# Altium footprint library AD_Lib.PcbLib: 508 footprints (part 11 of 32)
Each footprint in its own frame and in the unit in brackets; x right, y up, seen from the top. Pads: shape width x height; smd on the part's side, far side on the other; paste and mask are expansions set on the pad; w line width, h text height; cw(c..) or ccw(c..) is an arc to the next point about the centre after c.
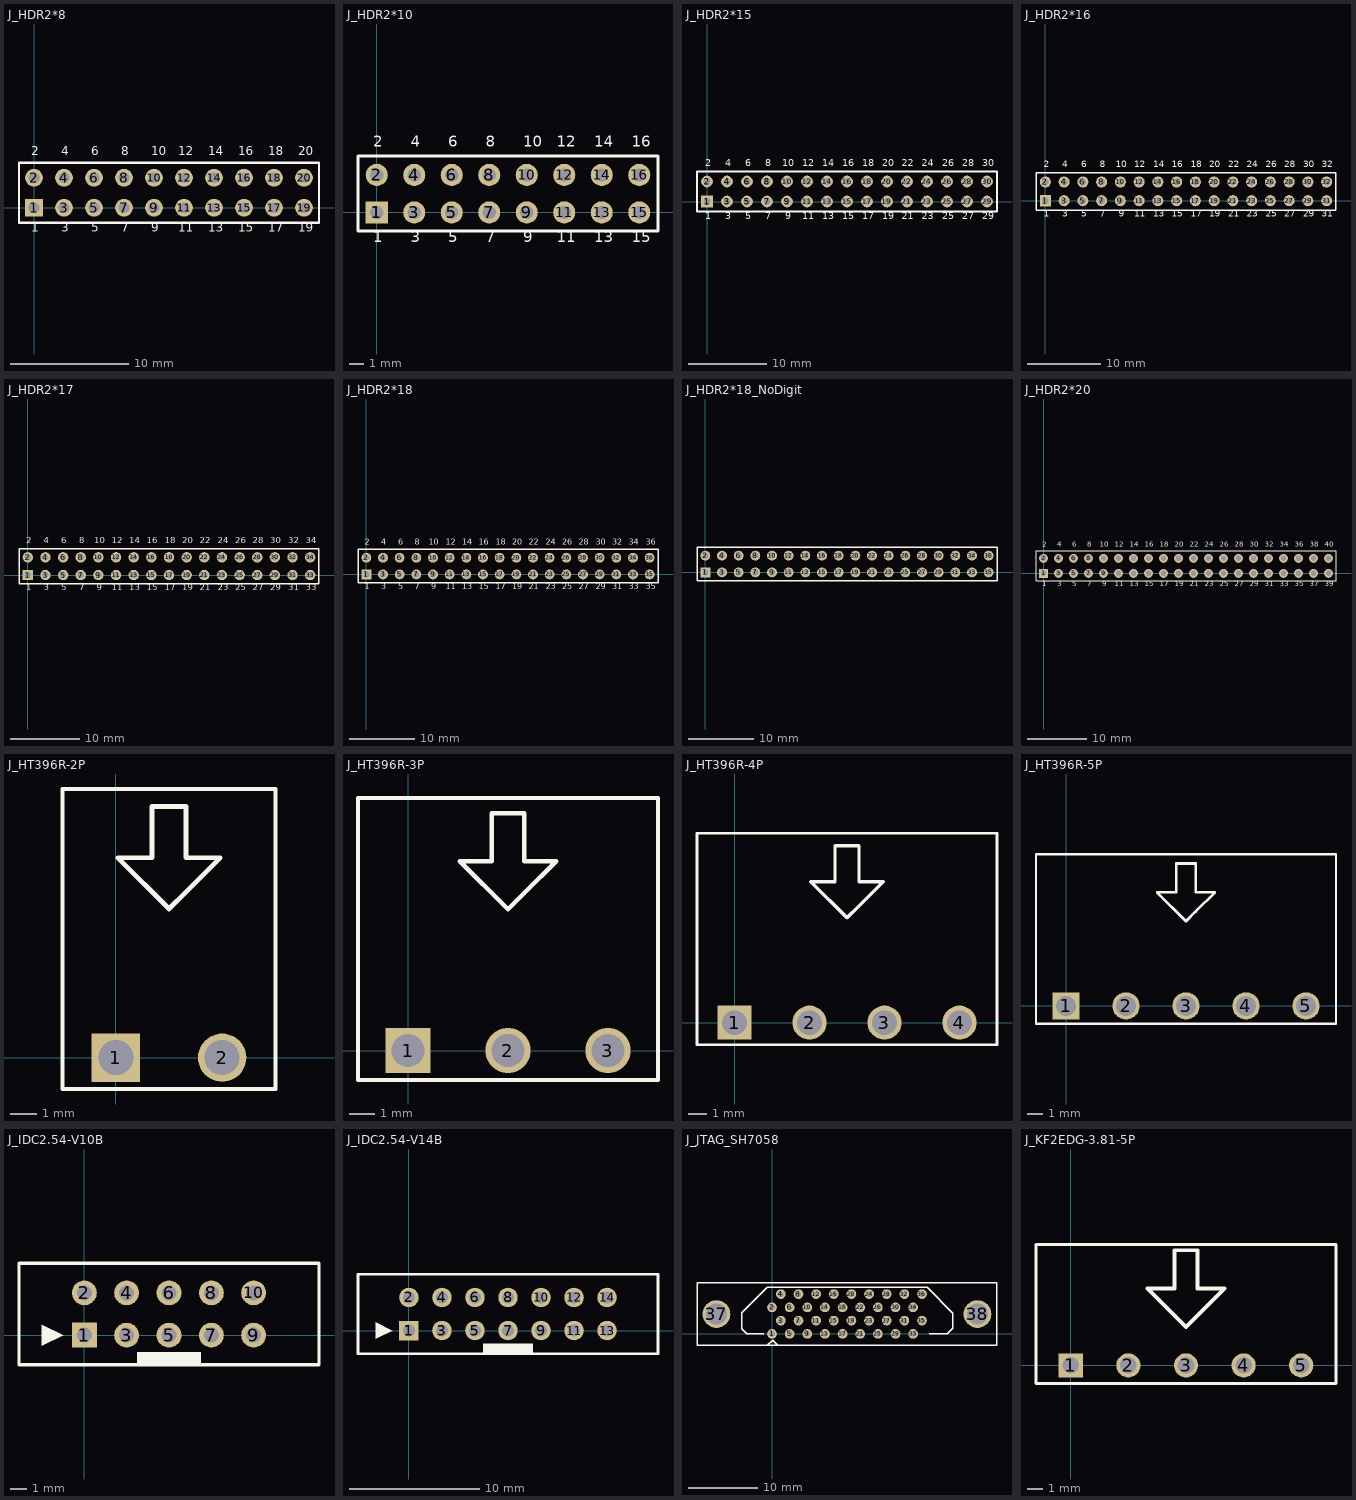
[diagram p10: the footprints below, top view; thin cyan lines are the x and y axes]

## J_HDR2*8 [mm] "Connector; Header; 2*8"
pads (20):
  rect 1.5x1.5 hole 0.9: 1(0,0)
  round 1.5 hole 0.9: 2(0,2.54) 3(2.54,0) 4(2.54,2.54) 5(5.08,0) 6(5.08,2.54) 7(7.62,0) 8(7.62,2.54) 9(10.16,0) 10(10.16,2.54) 11(12.7,0) 12(12.7,2.54) 13(15.24,0) 14(15.24,2.54) 15(17.78,0) 16(17.78,2.54) 17(20.32,0) 18(20.32,2.54) 19(22.86,0) 20(22.86,2.54)
Top Overlay:
  lines w0.2: -1.27,-1.27 -1.27,3.81 24.13,3.81 24.13,-1.27 -1.27,-1.27
  text "16" at 17.272,4.191 h1.27
  text "14" at 14.732,4.191 h1.27
  text "12" at 12.192,4.191 h1.27
  text "18" at 19.812,4.191 h1.27
  text "20" at 22.352,4.191 h1.27
  text "15" at 17.272,-2.286 h1.27
  text "13" at 14.732,-2.286 h1.27
  text "11" at 12.192,-2.286 h1.27
  text "17" at 19.812,-2.286 h1.27
  text "19" at 22.352,-2.286 h1.27
  text "10" at 9.906,4.191 h1.27
  text "8" at 7.366,4.191 h1.27
  text "6" at 4.826,4.191 h1.27
  text "4" at 2.286,4.191 h1.27
  text "2" at -0.254,4.191 h1.27
  text "9" at 9.906,-2.286 h1.27
  text "7" at 7.366,-2.286 h1.27
  text "5" at 4.826,-2.286 h1.27
  text "3" at 2.286,-2.286 h1.27
  text "1" at -0.254,-2.286 h1.27
Bottom Overlay:
  text "16" at 18.415,4.191 h1.27
  text "12" at 15.875,4.191 h1.27
  text "12" at 13.335,4.191 h1.27
  text "18" at 20.955,4.191 h1.27
  text "20" at 23.495,4.191 h1.27
  text "15" at 18.415,-2.286 h1.27
  text "13" at 15.875,-2.286 h1.27
  text "11" at 13.335,-2.286 h1.27
  text "17" at 20.955,-2.286 h1.27
  text "9" at 23.495,-2.286 h1.27
  text "1" at 0.254,-2.286 h1.27
  text "3" at 2.794,-2.286 h1.27
  text "5" at 5.334,-2.286 h1.27
  text "7" at 7.874,-2.286 h1.27
  text "9" at 10.414,-2.286 h1.27
  text "2" at 0.254,4.191 h1.27
  text "4" at 2.794,4.191 h1.27
  text "6" at 5.334,4.191 h1.27
  text "8" at 7.874,4.191 h1.27
  text "10" at 11.049,4.191 h1.27

## J_HDR2*10 [mm] "Connector; Header; 2*8"
pads (16):
  rect 1.5x1.5 hole 0.9: 1(0,0)
  round 1.5 hole 0.9: 2(0,2.54) 3(2.54,0) 4(2.54,2.54) 5(5.08,0) 6(5.08,2.54) 7(7.62,0) 8(7.62,2.54) 9(10.16,0) 10(10.16,2.54) 11(12.7,0) 12(12.7,2.54) 13(15.24,0) 14(15.24,2.54) 15(17.78,0) 16(17.78,2.54)
Top Overlay:
  lines w0.2: -1.27,-1.27 -1.27,3.81 19.05,3.81 19.05,-1.27 -1.27,-1.27
  text "16" at 17.272,4.191 h1.27
  text "14" at 14.732,4.191 h1.27
  text "12" at 12.192,4.191 h1.27
  text "15" at 17.272,-2.286 h1.27
  text "13" at 14.732,-2.286 h1.27
  text "11" at 12.192,-2.286 h1.27
  text "10" at 9.906,4.191 h1.27
  text "8" at 7.366,4.191 h1.27
  text "6" at 4.826,4.191 h1.27
  text "4" at 2.286,4.191 h1.27
  text "2" at -0.254,4.191 h1.27
  text "9" at 9.906,-2.286 h1.27
  text "7" at 7.366,-2.286 h1.27
  text "5" at 4.826,-2.286 h1.27
  text "3" at 2.286,-2.286 h1.27
  text "1" at -0.254,-2.286 h1.27
Bottom Overlay:
  text "16" at 18.415,4.191 h1.27
  text "12" at 15.875,4.191 h1.27
  text "12" at 13.335,4.191 h1.27
  text "15" at 18.415,-2.286 h1.27
  text "13" at 15.875,-2.286 h1.27
  text "11" at 13.335,-2.286 h1.27
  text "1" at 0.254,-2.286 h1.27
  text "3" at 2.794,-2.286 h1.27
  text "5" at 5.334,-2.286 h1.27
  text "7" at 7.874,-2.286 h1.27
  text "9" at 10.414,-2.286 h1.27
  text "2" at 0.254,4.191 h1.27
  text "4" at 2.794,4.191 h1.27
  text "6" at 5.334,4.191 h1.27
  text "8" at 7.874,4.191 h1.27
  text "10" at 11.049,4.191 h1.27

## J_HDR2*15 [mm] "Connector; Header; 2*15"
height 1.45
pads (30):
  rect 1.5x1.5 hole 0.9: 1(0,0)
  round 1.5 hole 0.9: 2(0,2.54) 3(2.54,0) 4(2.54,2.54) 5(5.08,0) 6(5.08,2.54) 7(7.62,0) 8(7.62,2.54) 9(10.16,0) 10(10.16,2.54) 11(12.7,0) 12(12.7,2.54) 13(15.24,0) 14(15.24,2.54) 15(17.78,0) 16(17.78,2.54) 17(20.32,0) 18(20.32,2.54) 19(22.86,0) 20(22.86,2.54) 21(25.4,0) 22(25.4,2.54) 23(27.94,0) 24(27.94,2.54) 25(30.48,0) 26(30.48,2.54) 27(33.02,0) 28(33.02,2.54) 29(35.56,0) 30(35.56,2.54)
Top Overlay:
  lines w0.2: -1.27,-1.27 36.83,-1.27 36.83,3.81 -1.27,3.81 -1.27,-1.27
  text "7" at 7.366,-2.54 h1.52
  text "5" at 4.826,-2.54 h1.52
  text "3" at 2.286,-2.54 h1.52
  text "1" at -0.254,-2.54 h1.52
  text "9" at 9.906,-2.54 h1.52
  text "11" at 12.065,-2.54 h1.52
  text "23" at 27.305,-2.54 h1.52
  text "21" at 24.765,-2.54 h1.52
  text "19" at 22.225,-2.54 h1.52
  text "17" at 19.685,-2.54 h1.52
  text "15" at 17.145,-2.54 h1.52
  text "13" at 14.605,-2.54 h1.52
  text "29" at 34.925,-2.54 h1.52
  text "27" at 32.385,-2.54 h1.52
  text "25" at 29.845,-2.54 h1.52
  text "26" at 29.845,4.191 h1.52
  text "28" at 32.385,4.191 h1.52
  text "30" at 34.925,4.191 h1.52
  text "14" at 14.605,4.191 h1.52
  text "16" at 17.145,4.191 h1.52
  text "18" at 19.685,4.191 h1.52
  text "20" at 22.225,4.191 h1.52
  text "22" at 24.765,4.191 h1.52
  text "24" at 27.305,4.191 h1.52
  text "12" at 12.065,4.191 h1.52
  text "10" at 9.525,4.191 h1.52
  text "2" at -0.254,4.191 h1.52
  text "4" at 2.286,4.191 h1.52
  text "6" at 4.826,4.191 h1.52
  text "8" at 7.366,4.191 h1.52
Bottom Overlay:
  text "12" at 13.208,4.191 h1.52
  text "24" at 28.448,4.191 h1.52
  text "22" at 25.908,4.191 h1.52
  text "20" at 23.368,4.191 h1.52
  text "18" at 20.828,4.191 h1.52
  text "16" at 18.288,4.191 h1.52
  text "14" at 15.748,4.191 h1.52
  text "30" at 36.068,4.191 h1.52
  text "28" at 33.528,4.191 h1.52
  text "26" at 30.988,4.191 h1.52
  text "10" at 10.541,4.191 h1.52
  text "2" at 0.254,4.191 h1.52
  text "4" at 2.794,4.191 h1.52
  text "6" at 5.334,4.191 h1.52
  text "8" at 7.874,4.191 h1.52
  text "7" at 7.874,-2.54 h1.52
  text "5" at 5.334,-2.54 h1.52
  text "3" at 2.794,-2.54 h1.52
  text "1" at 0.254,-2.54 h1.52
  text "9" at 10.414,-2.54 h1.52
  text "25" at 30.988,-2.54 h1.52
  text "27" at 33.528,-2.54 h1.52
  text "29" at 36.068,-2.54 h1.52
  text "13" at 15.748,-2.54 h1.52
  text "15" at 18.288,-2.54 h1.52
  text "17" at 20.828,-2.54 h1.52
  text "19" at 23.368,-2.54 h1.52
  text "21" at 25.908,-2.54 h1.52
  text "23" at 28.448,-2.54 h1.52
  text "11" at 13.208,-2.54 h1.52

## J_HDR2*16 [mm] "Connector; Header; 2*16"
height 1.45
pads (32):
  rect 1.5x1.5 hole 0.9: 1(0,0)
  round 1.5 hole 0.9: 2(0,2.54) 3(2.54,0) 4(2.54,2.54) 5(5.08,0) 6(5.08,2.54) 7(7.62,0) 8(7.62,2.54) 9(10.16,0) 10(10.16,2.54) 11(12.7,0) 12(12.7,2.54) 13(15.24,0) 14(15.24,2.54) 15(17.78,0) 16(17.78,2.54) 17(20.32,0) 18(20.32,2.54) 19(22.86,0) 20(22.86,2.54) 21(25.4,0) 22(25.4,2.54) 23(27.94,0) 24(27.94,2.54) 25(30.48,0) 26(30.48,2.54) 27(33.02,0) 28(33.02,2.54) 29(35.56,0) 30(35.56,2.54) 31(38.1,0) 32(38.1,2.54)
Top Overlay:
  lines w0.2: -1.27,-1.27 -1.27,3.81 39.37,3.81 39.37,-1.27 -1.27,-1.27
  text "8" at 7.366,4.191 h1.52
  text "6" at 4.826,4.191 h1.52
  text "4" at 2.286,4.191 h1.52
  text "2" at -0.254,4.191 h1.52
  text "10" at 9.525,4.191 h1.52
  text "12" at 12.065,4.191 h1.52
  text "24" at 27.305,4.191 h1.52
  text "22" at 24.765,4.191 h1.52
  text "20" at 22.225,4.191 h1.52
  text "18" at 19.685,4.191 h1.52
  text "16" at 17.145,4.191 h1.52
  text "14" at 14.605,4.191 h1.52
  text "30" at 34.925,4.191 h1.52
  text "28" at 32.385,4.191 h1.52
  text "26" at 29.845,4.191 h1.52
  text "25" at 29.845,-2.54 h1.52
  text "27" at 32.385,-2.54 h1.52
  text "29" at 34.925,-2.54 h1.52
  text "13" at 14.605,-2.54 h1.52
  text "15" at 17.145,-2.54 h1.52
  text "17" at 19.685,-2.54 h1.52
  text "19" at 22.225,-2.54 h1.52
  text "21" at 24.765,-2.54 h1.52
  text "23" at 27.305,-2.54 h1.52
  text "11" at 12.065,-2.54 h1.52
  text "9" at 9.906,-2.54 h1.52
  text "1" at -0.254,-2.54 h1.52
  text "3" at 2.286,-2.54 h1.52
  text "5" at 4.826,-2.54 h1.52
  text "7" at 7.366,-2.54 h1.52
  text "31" at 37.465,-2.54 h1.52
  text "32" at 37.465,4.191 h1.52
Bottom Overlay:
  text "11" at 13.208,-2.54 h1.52
  text "23" at 28.448,-2.54 h1.52
  text "21" at 25.908,-2.54 h1.52
  text "19" at 23.368,-2.54 h1.52
  text "17" at 20.828,-2.54 h1.52
  text "15" at 18.288,-2.54 h1.52
  text "13" at 15.748,-2.54 h1.52
  text "29" at 36.068,-2.54 h1.52
  text "27" at 33.528,-2.54 h1.52
  text "25" at 30.988,-2.54 h1.52
  text "9" at 10.414,-2.54 h1.52
  text "1" at 0.254,-2.54 h1.52
  text "3" at 2.794,-2.54 h1.52
  text "5" at 5.334,-2.54 h1.52
  text "7" at 7.874,-2.54 h1.52
  text "8" at 7.874,4.191 h1.52
  text "6" at 5.334,4.191 h1.52
  text "4" at 2.794,4.191 h1.52
  text "2" at 0.254,4.191 h1.52
  text "10" at 10.541,4.191 h1.52
  text "26" at 30.988,4.191 h1.52
  text "28" at 33.528,4.191 h1.52
  text "30" at 36.068,4.191 h1.52
  text "14" at 15.748,4.191 h1.52
  text "16" at 18.288,4.191 h1.52
  text "18" at 20.828,4.191 h1.52
  text "20" at 23.368,4.191 h1.52
  text "22" at 25.908,4.191 h1.52
  text "24" at 28.448,4.191 h1.52
  text "12" at 13.208,4.191 h1.52
  text "32" at 38.608,4.191 h1.52
  text "31" at 38.608,-2.54 h1.52

## J_HDR2*17 [mm] "Connector; Header; 2*17"
height 1.45
pads (34):
  rect 1.5x1.5 hole 0.9: 1(0,0)
  round 1.5 hole 0.9: 2(0,2.54) 3(2.54,0) 4(2.54,2.54) 5(5.08,0) 6(5.08,2.54) 7(7.62,0) 8(7.62,2.54) 9(10.16,0) 10(10.16,2.54) 11(12.7,0) 12(12.7,2.54) 13(15.24,0) 14(15.24,2.54) 15(17.78,0) 16(17.78,2.54) 17(20.32,0) 18(20.32,2.54) 19(22.86,0) 20(22.86,2.54) 21(25.4,0) 22(25.4,2.54) 23(27.94,0) 24(27.94,2.54) 25(30.48,0) 26(30.48,2.54) 27(33.02,0) 28(33.02,2.54) 29(35.56,0) 30(35.56,2.54) 31(38.1,0) 32(38.1,2.54) 33(40.64,0) 34(40.64,2.54)
Top Overlay:
  lines w0.2: -1.27,-1.27 -1.27,3.81 41.91,3.81 41.91,-1.27 -1.27,-1.27
  text "34" at 40.005,4.191 h1.52
  text "33" at 40.005,-2.54 h1.52
  text "8" at 7.366,4.191 h1.52
  text "6" at 4.826,4.191 h1.52
  text "4" at 2.286,4.191 h1.52
  text "2" at -0.254,4.191 h1.52
  text "10" at 9.525,4.191 h1.52
  text "12" at 12.065,4.191 h1.52
  text "24" at 27.305,4.191 h1.52
  text "22" at 24.765,4.191 h1.52
  text "20" at 22.225,4.191 h1.52
  text "18" at 19.685,4.191 h1.52
  text "16" at 17.145,4.191 h1.52
  text "14" at 14.605,4.191 h1.52
  text "30" at 34.925,4.191 h1.52
  text "28" at 32.385,4.191 h1.52
  text "26" at 29.845,4.191 h1.52
  text "25" at 29.845,-2.54 h1.52
  text "27" at 32.385,-2.54 h1.52
  text "29" at 34.925,-2.54 h1.52
  text "13" at 14.605,-2.54 h1.52
  text "15" at 17.145,-2.54 h1.52
  text "17" at 19.685,-2.54 h1.52
  text "19" at 22.225,-2.54 h1.52
  text "21" at 24.765,-2.54 h1.52
  text "23" at 27.305,-2.54 h1.52
  text "11" at 12.065,-2.54 h1.52
  text "9" at 9.906,-2.54 h1.52
  text "1" at -0.254,-2.54 h1.52
  text "3" at 2.286,-2.54 h1.52
  text "5" at 4.826,-2.54 h1.52
  text "7" at 7.366,-2.54 h1.52
  text "31" at 37.465,-2.54 h1.52
  text "32" at 37.465,4.191 h1.52
Bottom Overlay:
  text "33" at 41.148,-2.54 h1.52
  text "34" at 41.148,4.191 h1.52
  text "11" at 13.208,-2.54 h1.52
  text "23" at 28.448,-2.54 h1.52
  text "21" at 25.908,-2.54 h1.52
  text "19" at 23.368,-2.54 h1.52
  text "17" at 20.828,-2.54 h1.52
  text "15" at 18.288,-2.54 h1.52
  text "13" at 15.748,-2.54 h1.52
  text "29" at 36.068,-2.54 h1.52
  text "27" at 33.528,-2.54 h1.52
  text "25" at 30.988,-2.54 h1.52
  text "9" at 10.414,-2.54 h1.52
  text "1" at 0.254,-2.54 h1.52
  text "3" at 2.794,-2.54 h1.52
  text "5" at 5.334,-2.54 h1.52
  text "7" at 7.874,-2.54 h1.52
  text "8" at 7.874,4.191 h1.52
  text "6" at 5.334,4.191 h1.52
  text "4" at 2.794,4.191 h1.52
  text "2" at 0.254,4.191 h1.52
  text "10" at 10.541,4.191 h1.52
  text "26" at 30.988,4.191 h1.52
  text "28" at 33.528,4.191 h1.52
  text "30" at 36.068,4.191 h1.52
  text "14" at 15.748,4.191 h1.52
  text "16" at 18.288,4.191 h1.52
  text "18" at 20.828,4.191 h1.52
  text "20" at 23.368,4.191 h1.52
  text "22" at 25.908,4.191 h1.52
  text "24" at 28.448,4.191 h1.52
  text "12" at 13.208,4.191 h1.52
  text "32" at 38.608,4.191 h1.52
  text "31" at 38.608,-2.54 h1.52

## J_HDR2*18 [mm] "Connector; Header; 2*18"
height 1.45
pads (36):
  rect 1.5x1.5 hole 0.9: 1(0,0)
  round 1.5 hole 0.9: 2(0,2.54) 3(2.54,0) 4(2.54,2.54) 5(5.08,0) 6(5.08,2.54) 7(7.62,0) 8(7.62,2.54) 9(10.16,0) 10(10.16,2.54) 11(12.7,0) 12(12.7,2.54) 13(15.24,0) 14(15.24,2.54) 15(17.78,0) 16(17.78,2.54) 17(20.32,0) 18(20.32,2.54) 19(22.86,0) 20(22.86,2.54) 21(25.4,0) 22(25.4,2.54) 23(27.94,0) 24(27.94,2.54) 25(30.48,0) 26(30.48,2.54) 27(33.02,0) 28(33.02,2.54) 29(35.56,0) 30(35.56,2.54) 31(38.1,0) 32(38.1,2.54) 33(40.64,0) 34(40.64,2.54) 35(43.18,0) 36(43.18,2.54)
Top Overlay:
  lines w0.2: -1.27,-1.27 44.45,-1.27 44.45,3.81 -1.27,3.81 -1.27,-1.27
  text "36" at 42.545,4.191 h1.52
  text "35" at 42.545,-2.54 h1.52
  text "32" at 37.465,4.191 h1.52
  text "31" at 37.465,-2.54 h1.52
  text "7" at 7.366,-2.54 h1.52
  text "5" at 4.826,-2.54 h1.52
  text "3" at 2.286,-2.54 h1.52
  text "1" at -0.254,-2.54 h1.52
  text "9" at 9.906,-2.54 h1.52
  text "11" at 12.065,-2.54 h1.52
  text "23" at 27.305,-2.54 h1.52
  text "21" at 24.765,-2.54 h1.52
  text "19" at 22.225,-2.54 h1.52
  text "17" at 19.685,-2.54 h1.52
  text "15" at 17.145,-2.54 h1.52
  text "13" at 14.605,-2.54 h1.52
  text "29" at 34.925,-2.54 h1.52
  text "27" at 32.385,-2.54 h1.52
  text "25" at 29.845,-2.54 h1.52
  text "26" at 29.845,4.191 h1.52
  text "28" at 32.385,4.191 h1.52
  text "30" at 34.925,4.191 h1.52
  text "14" at 14.605,4.191 h1.52
  text "16" at 17.145,4.191 h1.52
  text "18" at 19.685,4.191 h1.52
  text "20" at 22.225,4.191 h1.52
  text "22" at 24.765,4.191 h1.52
  text "24" at 27.305,4.191 h1.52
  text "12" at 12.065,4.191 h1.52
  text "10" at 9.525,4.191 h1.52
  text "2" at -0.254,4.191 h1.52
  text "4" at 2.286,4.191 h1.52
  text "6" at 4.826,4.191 h1.52
  text "8" at 7.366,4.191 h1.52
  text "33" at 40.005,-2.54 h1.52
  text "34" at 40.005,4.191 h1.52
Bottom Overlay:
  text "35" at 43.688,-2.54 h1.52
  text "36" at 43.688,4.191 h1.52
  text "31" at 38.608,-2.54 h1.52
  text "32" at 38.608,4.191 h1.52
  text "12" at 13.208,4.191 h1.52
  text "24" at 28.448,4.191 h1.52
  text "22" at 25.908,4.191 h1.52
  text "20" at 23.368,4.191 h1.52
  text "18" at 20.828,4.191 h1.52
  text "16" at 18.288,4.191 h1.52
  text "14" at 15.748,4.191 h1.52
  text "30" at 36.068,4.191 h1.52
  text "28" at 33.528,4.191 h1.52
  text "26" at 30.988,4.191 h1.52
  text "10" at 10.541,4.191 h1.52
  text "2" at 0.254,4.191 h1.52
  text "4" at 2.794,4.191 h1.52
  text "6" at 5.334,4.191 h1.52
  text "8" at 7.874,4.191 h1.52
  text "7" at 7.874,-2.54 h1.52
  text "5" at 5.334,-2.54 h1.52
  text "3" at 2.794,-2.54 h1.52
  text "1" at 0.254,-2.54 h1.52
  text "9" at 10.414,-2.54 h1.52
  text "25" at 30.988,-2.54 h1.52
  text "27" at 33.528,-2.54 h1.52
  text "29" at 36.068,-2.54 h1.52
  text "13" at 15.748,-2.54 h1.52
  text "15" at 18.288,-2.54 h1.52
  text "17" at 20.828,-2.54 h1.52
  text "19" at 23.368,-2.54 h1.52
  text "21" at 25.908,-2.54 h1.52
  text "23" at 28.448,-2.54 h1.52
  text "11" at 13.208,-2.54 h1.52
  text "34" at 41.148,4.191 h1.52
  text "33" at 41.148,-2.54 h1.52

## J_HDR2*18_NoDigit [mm] "Connector; Header; 2*18"
height 1.45
pads (36):
  rect 1.5x1.5 hole 0.9: 1(0,0)
  round 1.5 hole 0.9: 2(0,2.54) 3(2.54,0) 4(2.54,2.54) 5(5.08,0) 6(5.08,2.54) 7(7.62,0) 8(7.62,2.54) 9(10.16,0) 10(10.16,2.54) 11(12.7,0) 12(12.7,2.54) 13(15.24,0) 14(15.24,2.54) 15(17.78,0) 16(17.78,2.54) 17(20.32,0) 18(20.32,2.54) 19(22.86,0) 20(22.86,2.54) 21(25.4,0) 22(25.4,2.54) 23(27.94,0) 24(27.94,2.54) 25(30.48,0) 26(30.48,2.54) 27(33.02,0) 28(33.02,2.54) 29(35.56,0) 30(35.56,2.54) 31(38.1,0) 32(38.1,2.54) 33(40.64,0) 34(40.64,2.54) 35(43.18,0) 36(43.18,2.54)
Top Overlay:
  lines w0.2: -1.27,-1.27 -1.27,3.81 44.45,3.81 44.45,-1.27 -1.27,-1.27

## J_HDR2*20 [mm] "Connector; Header; 2*20"
height 1.45
pads (40):
  rect 1.5x1.5 hole 0.9: 1(0,0)
  round 1.5 hole 0.9: 2(0,2.54) 3(2.54,0) 4(2.54,2.54) 5(5.08,0) 6(5.08,2.54) 7(7.62,0) 8(7.62,2.54) 9(10.16,0) 10(10.16,2.54) 11(12.7,0) 12(12.7,2.54) 13(15.24,0) 14(15.24,2.54) 15(17.78,0) 16(17.78,2.54) 17(20.32,0) 18(20.32,2.54) 19(22.86,0) 20(22.86,2.54) 21(25.4,0) 22(25.4,2.54) 23(27.94,0) 24(27.94,2.54) 25(30.48,0) 26(30.48,2.54) 27(33.02,0) 28(33.02,2.54) 29(35.56,0) 30(35.56,2.54) 31(38.1,0) 32(38.1,2.54) 33(40.64,0) 34(40.64,2.54) 35(43.18,0) 36(43.18,2.54) 37(45.72,0) 38(45.72,2.54) 39(48.26,0) 40(48.26,2.54)
Top Overlay:
  lines w0.2: -1.27,-1.27 49.53,-1.27 49.53,3.81 -1.27,3.81 -1.27,-1.27
  text "36" at 42.545,4.191 h1.52
  text "35" at 42.545,-2.54 h1.52
  text "32" at 37.465,4.191 h1.52
  text "31" at 37.465,-2.54 h1.52
  text "7" at 7.366,-2.54 h1.52
  text "5" at 4.826,-2.54 h1.52
  text "3" at 2.286,-2.54 h1.52
  text "1" at -0.254,-2.54 h1.52
  text "9" at 9.906,-2.54 h1.52
  text "11" at 12.065,-2.54 h1.52
  text "23" at 27.305,-2.54 h1.52
  text "21" at 24.765,-2.54 h1.52
  text "19" at 22.225,-2.54 h1.52
  text "17" at 19.685,-2.54 h1.52
  text "15" at 17.145,-2.54 h1.52
  text "13" at 14.605,-2.54 h1.52
  text "29" at 34.925,-2.54 h1.52
  text "27" at 32.385,-2.54 h1.52
  text "25" at 29.845,-2.54 h1.52
  text "26" at 29.845,4.191 h1.52
  text "28" at 32.385,4.191 h1.52
  text "30" at 34.925,4.191 h1.52
  text "14" at 14.605,4.191 h1.52
  text "16" at 17.145,4.191 h1.52
  text "18" at 19.685,4.191 h1.52
  text "20" at 22.225,4.191 h1.52
  text "22" at 24.765,4.191 h1.52
  text "24" at 27.305,4.191 h1.52
  text "12" at 12.065,4.191 h1.52
  text "10" at 9.525,4.191 h1.52
  text "2" at -0.254,4.191 h1.52
  text "4" at 2.286,4.191 h1.52
  text "6" at 4.826,4.191 h1.52
  text "8" at 7.366,4.191 h1.52
  text "33" at 40.005,-2.54 h1.52
  text "34" at 40.005,4.191 h1.52
  text "38" at 45.085,4.191 h1.52
  text "37" at 45.085,-2.54 h1.52
  text "39" at 47.625,-2.54 h1.52
  text "40" at 47.625,4.191 h1.52
Bottom Overlay:
  text "35" at 43.688,-2.54 h1.52
  text "36" at 43.688,4.191 h1.52
  text "31" at 38.608,-2.54 h1.52
  text "32" at 38.608,4.191 h1.52
  text "12" at 13.208,4.191 h1.52
  text "24" at 28.448,4.191 h1.52
  text "22" at 25.908,4.191 h1.52
  text "20" at 23.368,4.191 h1.52
  text "18" at 20.828,4.191 h1.52
  text "16" at 18.288,4.191 h1.52
  text "14" at 15.748,4.191 h1.52
  text "30" at 36.068,4.191 h1.52
  text "28" at 33.528,4.191 h1.52
  text "26" at 30.988,4.191 h1.52
  text "10" at 10.541,4.191 h1.52
  text "2" at 0.254,4.191 h1.52
  text "4" at 2.794,4.191 h1.52
  text "6" at 5.334,4.191 h1.52
  text "8" at 7.874,4.191 h1.52
  text "7" at 7.874,-2.54 h1.52
  text "5" at 5.334,-2.54 h1.52
  text "3" at 2.794,-2.54 h1.52
  text "1" at 0.254,-2.54 h1.52
  text "9" at 10.414,-2.54 h1.52
  text "25" at 30.988,-2.54 h1.52
  text "27" at 33.528,-2.54 h1.52
  text "29" at 36.068,-2.54 h1.52
  text "13" at 15.748,-2.54 h1.52
  text "15" at 18.288,-2.54 h1.52
  text "17" at 20.828,-2.54 h1.52
  text "19" at 23.368,-2.54 h1.52
  text "21" at 25.908,-2.54 h1.52
  text "23" at 28.448,-2.54 h1.52
  text "11" at 13.208,-2.54 h1.52
  text "34" at 41.148,4.191 h1.52
  text "33" at 41.148,-2.54 h1.52
  text "37" at 46.228,-2.54 h1.52
  text "38" at 46.228,4.191 h1.52
  text "40" at 48.768,4.191 h1.52
  text "39" at 48.768,-2.54 h1.52

## J_HT396R-2P [mm] "科发HT396R-3.96系列凤凰端子，弯针"
height 7.4
pads (2):
  rect 1.8x1.8 hole 1.3 square: 1(0,0)
  round 1.8 hole 1.3: 2(3.96,0)
Top Overlay:
  lines w0.152: -1.98,-1.168 -1.98,10 5.94,10 5.94,-1.168 -1.98,-1.168
  lines w0.178: 0.075,7.442 1.345,7.442 1.345,9.347 2.615,9.347 2.615,7.442 3.885,7.442 2.615,6.172 1.98,5.537 0.075,7.442

## J_HT396R-3P [mm] "科发HT396R-3.96系列凤凰端子"
height 7.4
pads (3):
  rect 1.8x1.8 hole 1.3 square: 1(0,0)
  round 1.8 hole 1.3: 2(3.96,0) 3(7.92,0)
Top Overlay:
  lines w0.152: -1.98,-1.168 -1.98,10 9.9,10 9.9,-1.168 -1.98,-1.168
  lines w0.178: 2.055,7.493 3.325,7.493 3.325,9.398 4.595,9.398 4.595,7.493 5.865,7.493 4.595,6.223 3.96,5.588 2.055,7.493

## J_HT396R-4P [mm] "科发HT396R-3.96系列凤凰端子，弯针"
height 7.4
pads (4):
  rect 1.8x1.8 hole 1.3 square: 1(0,0)
  round 1.8 hole 1.3: 2(3.96,0) 3(7.92,0) 4(11.88,0)
Top Overlay:
  lines w0.152: -1.98,-1.168 -1.98,10 13.86,10 13.86,-1.168 -1.98,-1.168
  lines w0.178: 4.035,7.442 5.94,5.537 6.575,6.172 7.845,7.442 6.575,7.442 6.575,9.347 5.305,9.347 5.305,7.442 4.035,7.442

## J_HT396R-5P [mm] "科发HT396R-3.96系列凤凰端子，弯针"
height 7.4
pads (5):
  rect 1.8x1.8 hole 1.3 square: 1(0,0)
  round 1.8 hole 1.3: 2(3.96,0) 3(7.92,0) 4(11.88,0) 5(15.84,0)
Top Overlay:
  lines w0.152: -1.98,-1.168 -1.98,10 17.82,10 17.82,-1.168 -1.98,-1.168
  lines w0.178: 6.015,7.493 7.285,7.493 7.285,9.398 8.555,9.398 8.555,7.493 9.825,7.493 8.555,6.223 7.92,5.588 6.015,7.493

## J_IDC2.54-V10B [mm] "Connector; IDC, PCB Transition - 2 Rows, Thru-Hole; 10 Position; Vertical; Pitch 2.54 mm; Body 18.00 x 6.1 x 7.45 mm (LxWxH)"
height 7.45
pads (10):
  rect 1.5x1.5 hole 0.9: 1(0,0)
  round 1.5 hole 0.9: 2(0,2.54) 3(2.54,0) 4(2.54,2.54) 5(5.08,0) 6(5.08,2.54) 7(7.62,0) 8(7.62,2.54) 9(10.16,0) 10(10.16,2.54)
Top Overlay:
  rectangle: 3.175,-1.778 6.985,-1.016
  region: -1.27,0 -2.54,-0.635 -2.54,0.635
  lines w0.2: -3.92,-1.78 14.08,-1.78 14.08,4.32 -3.92,4.32 -3.92,-1.78

## J_IDC2.54-V14B [mm] "Connector; IDC, PCB Transition - 2 Rows, Thru-Hole; 10 Position; Vertical; Pitch 2.54 mm; Body 18.00 x 6.1 x 7.45 mm (LxWxH)"
height 7.45
pads (14):
  rect 1.5x1.5 hole 0.9: 1(0,0)
  round 1.5 hole 0.9: 2(0,2.54) 3(2.54,0) 4(2.54,2.54) 5(5.08,0) 6(5.08,2.54) 7(7.62,0) 8(7.62,2.54) 9(10.16,0) 10(10.16,2.54) 11(12.7,0) 12(12.7,2.54) 13(15.24,0) 14(15.24,2.54)
Top Overlay:
  rectangle: 5.715,-1.774 9.525,-1.012
  region: -1.27,0 -2.54,-0.635 -2.54,0.635
  lines w0.2: -3.92,-1.78 -3.92,4.32 19.16,4.32 19.16,-1.78 -3.92,-1.78

## J_JTAG_SH7058 [mm] "SH7058调试接头"
height 1.75
pads (38):
  round 1.4 hole 0.8: 1(0,0) 2(0,3.81) 3(1.27,1.905) 4(1.27,5.715) 5(2.54,0) 6(2.54,3.81) 7(3.81,1.905) 8(3.81,5.715) 9(5.08,0) 10(5.08,3.81) 11(6.35,1.905) 12(6.35,5.715) 13(7.62,0) 14(7.62,3.81) 15(8.89,1.905) 16(8.89,5.715) 17(10.16,0) 18(10.16,3.81) 19(11.43,1.905) 20(11.43,5.715) 21(12.7,0) 22(12.7,3.81) 23(13.97,1.905) 24(13.97,5.715) 25(15.24,0) 26(15.24,3.81) 27(16.51,1.905) 28(16.51,5.715) 29(17.78,0) 30(17.78,3.81) 31(19.05,1.905) 32(19.05,5.715) 33(20.32,0) 34(20.32,3.81) 35(21.59,1.905) 36(21.59,5.715)
  round 4 hole 3: 37(-8.001,2.845) 38(29.566,2.845)
Top Overlay:
  lines w0.203: -1.194,0 -3.607,0 -4.369,0.762 -4.369,3.023 -0.711,6.68 22.327,6.68 26.035,2.972 26.035,2.108 26.035,0.813 25.222,0 22.631,0 ; -0.889,-1.651 32.385,-1.651 32.385,7.366 -10.795,7.366 -10.795,-1.651 -6.121,-1.651 -0.66,-1.651 0.076,-0.914 0.813,-1.651 1.346,-1.651 ; 14.529,-1.651 21.412,-1.651

## J_KF2EDG-3.81-5P [mm] "引脚间距3.81mm，弯针。A=angle"
height 7
pads (5):
  rect 1.6x1.6 hole 1.1: 1(0,0)
  round 1.6 hole 1.1: 2(3.81,0) 3(7.62,0) 4(11.43,0) 5(15.24,0)
Top Overlay:
  lines w0.178: -2.3,-1.2 -2.3,8 17.54,8 17.54,-1.2 -2.3,-1.2
  lines w0.254: 5.08,5.08 7.62,2.54 10.16,5.08 8.382,5.08 8.382,7.62 6.858,7.62 6.858,5.08 5.08,5.08